# Altium footprint library PCB-PCEIOT.PcbLib: 119 footprints (part 2 of 8)
Each footprint in its own frame and in the unit in brackets; x right, y up, seen from the top. Pads: shape width x height; smd on the part's side, far side on the other; paste and mask are expansions set on the pad; w line width, h text height; cw(c..) or ccw(c..) is an arc to the next point about the centre after c.
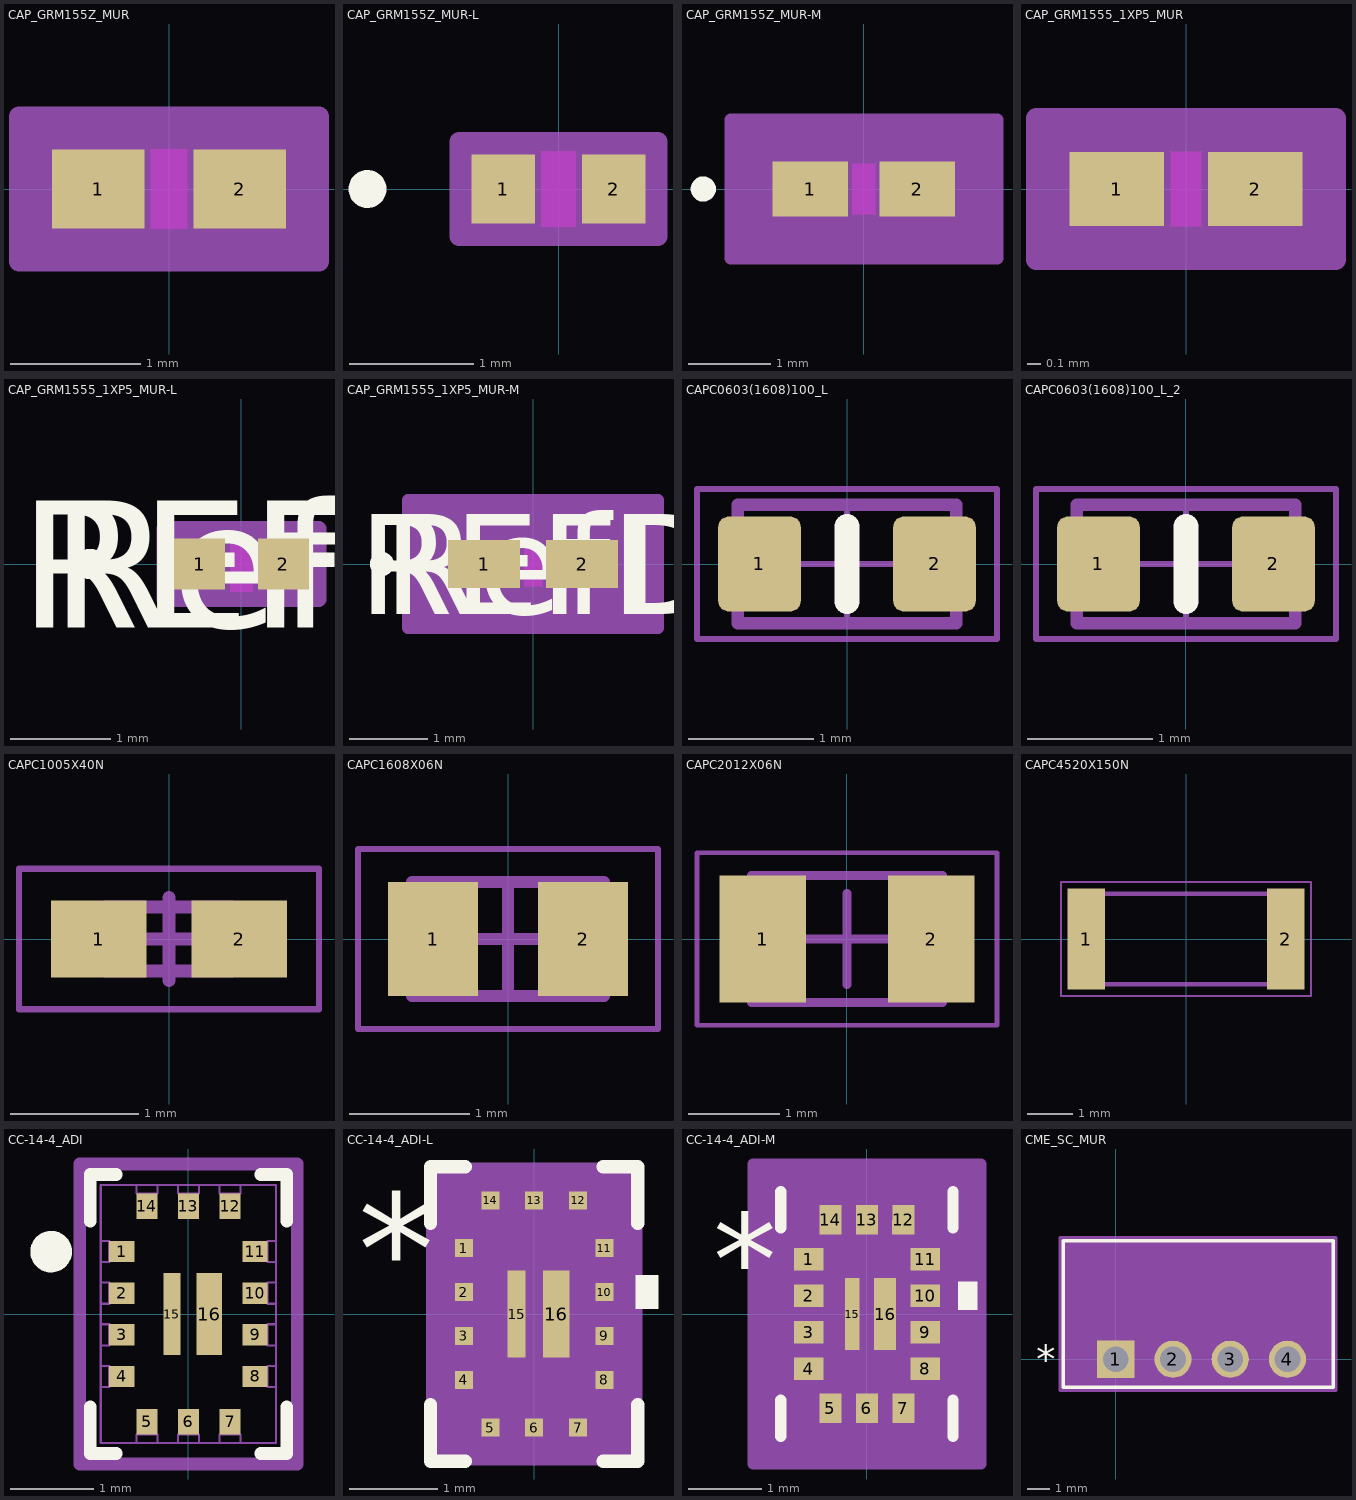
[diagram p1: the footprints below, top view; thin cyan lines are the x and y axes]

## CAP_GRM155Z_MUR [mil]
pads (2):
  rect 28x24 smd paste+0 mask+0: 1(-21.5,0) 2(21.5,0)
Top Layer keep-out:
  region: -5.5,-10 -5.5,10 5.5,10 5.5,-10
Keep-Out Layer:
  region: -5.5,-12 -5.5,12 5.5,12 5.5,-12
Mechanical 13:
  lines w1: -21.5,-12 -21.5,12 ; -21.5,-12 21.5,-12 ; -21.5,-12 -7.5,-12 -7.5,12 -21.5,12 ; -21.5,-12 -21.5,12 ; -21.5,12 21.5,12 ; 21.5,-12 21.5,12 ; 21.5,-12 21.5,12 ; 21.5,-12 7.5,-12 7.5,12 21.5,12
Mechanical 15:
  region: 45.5,-22 -45.5,-22 -45.5,22 45.5,22
  lines w6: -45.5,-22 45.5,-22 45.5,22 -45.5,22 -45.5,-22
3D body "CAP_GRM155Z_MUR.step": height 24.02, standoff 0, extent -21.5,-12.01 21.5,12.01

## CAP_GRM155Z_MUR-L [mil]
pads (2):
  rect 20x22 smd paste+0 mask+0: 1(-17.5,0) 2(17.5,0)
Top Layer keep-out:
  region: -5.5,-10 -5.5,10 5.5,10 5.5,-10
Top Overlay:
  circle w6: c-60.5,0 r3
Keep-Out Layer:
  region: -5.5,-12 -5.5,12 5.5,12 5.5,-12
Mechanical 13:
  circle w1: c-12.5,0 r3
  lines w1: -21.5,-12 -21.5,12 ; -21.5,-12 -7.5,-12 -7.5,12 -21.5,12 ; -21.5,-12 21.5,-12 ; -21.5,-12 -21.5,12 ; -21.5,12 21.5,12 ; 21.5,-12 7.5,-12 7.5,12 21.5,12 ; 21.5,-12 21.5,12 ; 21.5,-12 21.5,12
Mechanical 15:
  region: 31.5,-15 -31.5,-15 -31.5,15 31.5,15
  lines w6: -31.5,-15 -31.5,15 31.5,15 31.5,-15 -31.5,-15
3D body "CAP_GRM155Z_MUR.step": height 24.02, standoff 0, extent -21.5,-12.01 21.5,12.01

## CAP_GRM155Z_MUR-M [mil]
pads (2):
  rect 36x26 smd paste+0 mask+0: 1(-25.5,0) 2(25.5,0)
Top Layer keep-out:
  region: -5.5,-10 -5.5,10 5.5,10 5.5,-10
Top Overlay:
  circle w6: c-76.5,0 r3
Keep-Out Layer:
  region: -5.5,-12 -5.5,12 5.5,12 5.5,-12
Mechanical 13:
  circle w1: c-20.5,0 r3
  lines w1: -21.5,-12 -21.5,12 ; -21.5,-12 -7.5,-12 -7.5,12 -21.5,12 ; -21.5,-12 21.5,-12 ; -21.5,-12 -21.5,12 ; -21.5,12 21.5,12 ; 21.5,-12 7.5,-12 7.5,12 21.5,12 ; 21.5,-12 21.5,12 ; 21.5,-12 21.5,12
Mechanical 15:
  region: 63.5,-33 -63.5,-33 -63.5,33 63.5,33
  lines w6: -63.5,-33 -63.5,33 63.5,33 63.5,-33 -63.5,-33
3D body "CAP_GRM155Z_MUR.step": height 24.02, standoff 0, extent -21.5,-12.01 21.5,12.01

## CAP_GRM1555_1XP5_MUR [mil]
pads (2):
  rect 28x22 smd paste+0 mask+0: 1(-20.5,0) 2(20.5,0)
Top Layer keep-out:
  region: -4.5,-9 -4.5,9 4.5,9 4.5,-9
Top Overlay:
  text ".Designator" at -45,-20 h50
Keep-Out Layer:
  region: -4.5,-11 -4.5,11 4.5,11 4.5,-11
Mechanical 13:
  lines w1: -20.5,-11 -20.5,11 ; -20.5,-11 -6.5,-11 -6.5,11 -20.5,11 ; -20.5,-11 20.5,-11 ; -20.5,-11 -20.5,11 ; -20.5,11 20.5,11 ; 20.5,-11 6.5,-11 6.5,11 20.5,11 ; 20.5,-11 20.5,11 ; 20.5,-11 20.5,11
Mechanical 15:
  region: 44.5,-21 -44.5,-21 -44.5,21 44.5,21
  lines w6: -44.5,-21 -44.5,21 44.5,21 44.5,-21 -44.5,-21
3D body "CAP_GRM1555_1XP5_MUR.step": height 22.01, standoff 0, extent -20.51,-10.98 20.51,10.98

## CAP_GRM1555_1XP5_MUR-L [mil]
pads (2):
  rect 20x20 smd paste+0 mask+0: 1(-16.5,0) 2(16.5,0)
Top Layer keep-out:
  region: -4.5,-9 -4.5,9 4.5,9 4.5,-9
Top Overlay:
  circle w6: c-59.5,0 r3
  text "REFDES" at -87.5,-25 h50
  text "RefDes" at -75,-25 h50
Keep-Out Layer:
  region: -4.5,-11 -4.5,11 4.5,11 4.5,-11
Mechanical 13:
  circle w0: c-11.5,0 r3
  lines w1: -20.5,-11 -20.5,11 ; -20.5,-11 20.5,-11 ; -20.5,-11 -6.5,-11 -6.5,11 -20.5,11 ; -20.5,-11 -20.5,11 ; -20.5,11 20.5,11 ; 20.5,-11 20.5,11 ; 20.5,-11 20.5,11 ; 20.5,-11 6.5,-11 6.5,11 20.5,11
  text "RefDes2" at -87.5,-25 h50
Mechanical 15:
  region: 30.5,-14 -30.5,-14 -30.5,14 30.5,14
  lines w6: -30.5,-14 30.5,-14 30.5,14 -30.5,14 -30.5,-14
3D body "CAP_GRM1555_1XP5_MUR.step": height 22.01, standoff 0, extent -20.51,-10.98 20.51,10.98

## CAP_GRM1555_1XP5_MUR-M [mil]
pads (2):
  rect 36x24 smd paste+0 mask+0: 1(-24.5,0) 2(24.5,0)
Top Layer keep-out:
  region: -4.5,-9 -4.5,9 4.5,9 4.5,-9
Top Overlay:
  circle w6: c-75.5,0 r3
  text "RefDes" at -75,-25 h50
  text "REFDES" at -87.5,-25 h50
Keep-Out Layer:
  region: -4.5,-11 -4.5,11 4.5,11 4.5,-11
Mechanical 13:
  circle w0: c-19.5,0 r3
  lines w1: -20.5,-11 -20.5,11 ; -20.5,-11 -6.5,-11 -6.5,11 -20.5,11 ; -20.5,-11 20.5,-11 ; -20.5,-11 -20.5,11 ; -20.5,11 20.5,11 ; 20.5,-11 6.5,-11 6.5,11 20.5,11 ; 20.5,-11 20.5,11 ; 20.5,-11 20.5,11
  text "RefDes2" at -87.5,-25 h50
Mechanical 15:
  region: 62.5,-32 -62.5,-32 -62.5,32 62.5,32
  lines w6: -62.5,-32 -62.5,32 62.5,32 62.5,-32 -62.5,-32
3D body "CAP_GRM1555_1XP5_MUR.step": height 22.01, standoff 0, extent -20.51,-10.98 20.51,10.98

## CAPC0603(1608)100_L [mm] "Chip Capacitor, Body 1.6x0.8mm, Height 1.0mm, IPC High Density"
height 1
pads (2):
  rrect25% 0.66x0.76 smd: 1(-0.7,0) 2(0.7,0)
Top Overlay:
  lines w0.2: 0,-0.3 0,0.3
Top Courtyard:
  lines w0.05: -0.475,0 0.475,0 ; 0,-0.475 0,0.475 ; -1.2,-0.6 -1.2,0.6 1.2,0.6 1.2,-0.6 -1.2,-0.6
Top Assembly:
  lines w0.1: -0.875,-0.475 0.875,-0.475 0.875,0.475 -0.875,0.475 -0.875,-0.475
Top Designator:
  text ".Designator" at -1.27,-0.127 h0.6
3D body "CAPC1608X95N EIA 0603.STEP": height 0.95, standoff 0, extent -0.8,-0.4 0.8,0.4

## CAPC0603(1608)100_L_2 [mm]
pads (2):
  rrect25% 0.66x0.76 smd: 1(-0.7,0) 2(0.7,0)
Top Overlay:
  lines w0.2: 0,-0.3 0,0.3
Top Courtyard:
  lines w0.05: -0.475,0 0.475,0 ; 0,-0.475 0,0.475 ; -1.2,-0.6 1.2,-0.6 1.2,0.6 -1.2,0.6 -1.2,-0.6
Top Assembly:
  lines w0.1: -0.875,-0.475 -0.875,0.475 0.875,0.475 0.875,-0.475 -0.875,-0.475
Top Designator:
  text ".Designator" at -1.27,-0.127 h1.5
3D body "CAPC1608X95N EIA 0603.STEP": height 0.95, standoff 0, extent -0.8,-0.4 0.8,0.4

## CAPC1005X40N [mm] "Chip Capacitor, 2-Leads, Body 1,0x0,50mm (0402), IPC Medium Density"
pads (2):
  rect 0.75x0.6 smd: 1(-0.55,0) 2(0.55,0)
Mechanical 13:
  lines w0.1: -0.5,-0.25 -0.5,0.25 0.5,0.25 0.5,-0.25 -0.5,-0.25
Mechanical 15:
  lines w0.05: -1.175,-0.55 -1.175,0.55 1.175,0.55 1.175,-0.55 -1.175,-0.55
  lines w0.1: -0.325,0 0.325,0 ; 0,-0.325 0,0.325
  text ".Designator" at 0.272,-2.705 h1.2
3D body "GRM155C81H683KE14D.stp": height 0.55, standoff 0, extent -0.5,-0.25 0.5,0.25

## CAPC1608X06N [mm] "Chip Capacitor, 2-Leads, Body 1,6x0,8mm (0603), IPC Medium Density"
height 0.6
pads (2):
  rect 0.75x0.95 smd: 1(-0.625,0) 2(0.625,0)
Mechanical 13:
  lines w0.1: -0.8,-0.475 -0.8,0.475 0.8,0.475 0.8,-0.475 -0.8,-0.475
Mechanical 15:
  lines w0.05: -1.25,-0.75 -1.25,0.75 1.25,0.75 1.25,-0.75 -1.25,-0.75
  lines w0.1: -0.475,0 0.475,0 ; 0,-0.475 0,0.475
  text ".Designator" at 0.272,-2.705 h1.2
3D body "CAPC-0603-T0.9-BN.stp": height 0.9, standoff 0, extent -0.85,-0.45 0.85,0.45

## CAPC2012X06N [mm] "Chip Capacitor, 2-Leads, Body 2,00x1,25mm (0805), IPC Medium Density"
height 0.55
pads (2):
  rect 0.95x1.4 smd: 1(-0.925,0) 2(0.925,0)
Mechanical 13:
  lines w0.1: -1.05,-0.7 -1.05,0.7 1.05,0.7 1.05,-0.7 -1.05,-0.7
Mechanical 15:
  lines w0.05: -1.65,-0.95 -1.65,0.95 1.65,0.95 1.65,-0.95 -1.65,-0.95
  lines w0.1: -0.5,0 0.5,0 ; 0,-0.5 0,0.5
  text ".Designator" at 0.272,-2.705 h1.2
3D body "CAPC-0805-T0.75-BN.stp": height 0.75, standoff 0, extent -1.05,-0.675 1.05,0.675

## CAPC4520X150N [mm]
pads (2):
  rect 0.82x2.22 smd: 1(-2.2,0) 2(2.2,0)
Mechanical 13:
  lines w0.1: -2.25,-1 2.25,-1 2.25,1 -2.25,1 -2.25,-1
Mechanical 15:
  lines w0.05: -2.76,-1.26 2.76,-1.26 2.76,1.26 -2.76,1.26 -2.76,-1.26
  text ".Designator" at 0.272,-2.705 h1.2
3D body "GR442QR73D102KW01L.stp": height 1.5, standoff 0, extent -2.25,-1 2.25,1

## CC-14-4_ADI [mil]
pads (16):
  rect 12x10 smd paste+0 mask+0: 1(-31.5,29.53) 2(-31.5,9.84) 3(-31.5,-9.84) 4(-31.5,-29.53) 8(31.5,-29.53) 9(31.5,-9.84) 10(31.5,9.84) 11(31.5,29.53)
  rect 10x12 smd paste+0 mask+0: 5(-19.68,-51) 6(0,-51) 7(19.68,-51) 12(19.68,51) 13(0,51) 14(-19.68,51)
  rect 8x39 smd paste+0 mask+0: 15(-7.87,0)
  rect 12x39 smd paste+0 mask+0: 16(9.84,0)
Top Overlay:
  circle w9.84: c-65,29.53 r4.92
  lines w6: -46.5,-44.05 -46.5,-66 -34.2,-66 ; -46.5,44.05 -46.5,66 -34.2,66 ; 34.2,-66 46.5,-66 46.5,-44.05 ; 34.2,66 46.5,66 46.5,44.05
Mechanical 13:
  lines w1: -41.5,-61 41.5,-61 41.5,61 -41.5,61 -41.5,-61 ; -41.5,-34.53 -41.5,-24.53 -37.5,-24.53 -37.5,-34.53 -41.5,-34.53 ; -41.5,-14.84 -41.5,-4.84 -37.5,-4.84 -37.5,-14.84 -41.5,-14.84 ; -41.5,4.84 -41.5,14.84 -37.5,14.84 -37.5,4.84 -41.5,4.84 ; -41.5,24.53 -41.5,34.53 -37.5,34.53 -37.5,24.53 -41.5,24.53 ; -24.68,-61 -14.69,-61 -14.69,-57 -24.68,-57 -24.68,-61 ; -24.68,57 -14.69,57 -14.69,61 -24.68,61 -24.68,57 ; -5,-61 5,-61 5,-57 -5,-57 -5,-61 ; -5,57 5,57 5,61 -5,61 -5,57 ; 14.69,-61 24.68,-61 24.68,-57 14.69,-57 14.69,-61 ; 14.69,57 24.68,57 24.68,61 14.69,61 14.69,57 ; 37.5,-34.53 41.5,-34.53 41.5,-24.53 37.5,-24.53 37.5,-34.53 ; 37.5,-14.84 41.5,-14.84 41.5,-4.84 37.5,-4.84 37.5,-14.84 ; 37.5,4.84 41.5,4.84 41.5,14.84 37.5,14.84 37.5,4.84 ; 37.5,24.53 41.5,24.53 41.5,34.53 37.5,34.53 37.5,24.53
Mechanical 15:
  lines w6: -51.5,-71 -51.5,-44.53 -51.5,44.53 -51.5,71 -34.69,71 34.69,71 51.5,71 51.5,44.53 51.5,-44.53 51.5,-71 34.69,-71 -34.69,-71 -51.5,-71
  text ".Designator" at 14.54,-106.48 h47.24
3D body "CC-14-4_ADI.step": height 29.09, standoff 0, extent -41.5,-60.98 41.5,60.98

## CC-14-4_ADI-L [mil]
pads (16):
  rect 8.06x8.03 smd paste+0 mask+0: 1(-31.5,29.53) 2(-31.5,9.84) 3(-31.5,-9.84) 4(-31.5,-29.53) 8(31.5,-29.53) 9(31.5,-9.84) 10(31.5,9.84) 11(31.5,29.53)
  rect 8.03x8.06 smd paste+0 mask+0: 5(-19.68,-51) 6(0,-51) 7(19.68,-51) 12(19.68,51) 13(0,51) 14(-19.68,51)
  rect 8x39 smd paste+0 mask+0: 15(-7.87,0)
  rect 12x39 smd paste+0 mask+0: 16(9.84,0)
Top Overlay:
  region: 45.53,17.34 55.53,17.34 55.53,2.34 45.53,2.34
  lines w6: -46.5,-40.71 -46.5,-66 -30.86,-66 ; -46.5,40.71 -46.5,66 -30.86,66 ; 30.86,-66 46.5,-66 46.5,-40.71 ; 30.86,66 46.5,66 46.5,40.71
  text "*" at -79.03,4.53 h50
Mechanical 13:
  lines w1: -41.5,11 8.5,61 ; -41.5,-61 41.5,-61 41.5,61 -41.5,61 -41.5,-61 ; -41.5,-34.53 -41.5,-24.53 -37.5,-24.53 -37.5,-34.53 -41.5,-34.53 ; -41.5,-14.84 -41.5,-4.84 -37.5,-4.84 -37.5,-14.84 -41.5,-14.84 ; -41.5,4.84 -41.5,14.84 -37.5,14.84 -37.5,4.84 -41.5,4.84 ; -41.5,24.53 -41.5,34.53 -37.5,34.53 -37.5,24.53 -41.5,24.53 ; -24.68,-61 -14.69,-61 -14.69,-57 -24.68,-57 -24.68,-61 ; -24.68,57 -14.69,57 -14.69,61 -24.68,61 -24.68,57 ; -5,-61 5,-61 5,-57 -5,-57 -5,-61 ; -5,57 5,57 5,61 -5,61 -5,57 ; 14.69,-61 24.68,-61 24.68,-57 14.69,-57 14.69,-61 ; 14.69,57 24.68,57 24.68,61 14.69,61 14.69,57 ; 37.5,-34.53 41.5,-34.53 41.5,-24.53 37.5,-24.53 37.5,-34.53 ; 37.5,-14.84 41.5,-14.84 41.5,-4.84 37.5,-4.84 37.5,-14.84 ; 37.5,4.84 41.5,4.84 41.5,14.84 37.5,14.84 37.5,4.84 ; 37.5,24.53 41.5,24.53 41.5,34.53 37.5,34.53 37.5,24.53
Mechanical 15:
  region: -27.7,-65 -45.5,-65 -45.5,-37.54 -45.5,37.54 -45.5,65 -27.7,65 27.7,65 45.5,65 45.5,37.54 45.5,-37.54 45.5,-65 27.7,-65
  lines w6: -45.5,-65 -45.5,-37.54 -45.5,37.54 -45.5,65 -27.7,65 27.7,65 45.5,65 45.5,37.54 45.5,-37.54 45.5,-65 27.7,-65 -27.7,-65 -45.5,-65
3D body "CC-14-4_ADI.step": height 29.09, standoff 0, extent -41.5,-60.98 41.5,60.98

## CC-14-4_ADI-M [mil]
pads (16):
  rect 15.94x11.97 smd paste+0 mask+0: 1(-31.5,29.53) 2(-31.5,9.84) 3(-31.5,-9.84) 4(-31.5,-29.53) 8(31.5,-29.53) 9(31.5,-9.84) 10(31.5,9.84) 11(31.5,29.53)
  rect 11.97x15.94 smd paste+0 mask+0: 5(-19.68,-51) 6(0,-51) 7(19.68,-51) 12(19.68,51) 13(0,51) 14(-19.68,51)
  rect 8x39 smd paste+0 mask+0: 15(-7.87,0)
  rect 12x39 smd paste+0 mask+0: 16(9.84,0)
Top Overlay:
  region: 49.47,17.34 59.47,17.34 59.47,2.34 49.47,2.34
  lines w6: -46.5,-66 -46.5,-46.56 ; -46.5,46.56 -46.5,66 ; 46.5,-66 46.5,-46.56 ; 46.5,46.56 46.5,66
  text "*" at -82.97,4.53 h50
Mechanical 13:
  lines w1: -41.5,11 8.5,61 ; -41.5,-61 41.5,-61 41.5,61 -41.5,61 -41.5,-61 ; -41.5,-34.53 -41.5,-24.53 -37.5,-24.53 -37.5,-34.53 -41.5,-34.53 ; -41.5,-14.84 -41.5,-4.84 -37.5,-4.84 -37.5,-14.84 -41.5,-14.84 ; -41.5,4.84 -41.5,14.84 -37.5,14.84 -37.5,4.84 -41.5,4.84 ; -41.5,24.53 -41.5,34.53 -37.5,34.53 -37.5,24.53 -41.5,24.53 ; -24.68,-61 -14.69,-61 -14.69,-57 -24.68,-57 -24.68,-61 ; -24.68,57 -14.69,57 -14.69,61 -24.68,61 -24.68,57 ; -5,-61 5,-61 5,-57 -5,-57 -5,-61 ; -5,57 5,57 5,61 -5,61 -5,57 ; 14.69,-61 24.68,-61 24.68,-57 14.69,-57 14.69,-61 ; 14.69,57 24.68,57 24.68,61 14.69,61 14.69,57 ; 37.5,-34.53 41.5,-34.53 41.5,-24.53 37.5,-24.53 37.5,-34.53 ; 37.5,-14.84 41.5,-14.84 41.5,-4.84 37.5,-4.84 37.5,-14.84 ; 37.5,4.84 41.5,4.84 41.5,14.84 37.5,14.84 37.5,4.84 ; 37.5,24.53 41.5,24.53 41.5,34.53 37.5,34.53 37.5,24.53
  text "*" at -5.03,4.53 h50
Mechanical 15:
  region: -45.67,-81 -61.5,-81 -61.5,-55.51 -61.5,55.51 -61.5,81 -45.67,81 45.67,81 61.5,81 61.5,55.51 61.5,-55.51 61.5,-81 45.67,-81
  lines w6: -61.5,-81 -61.5,-55.51 -61.5,55.51 -61.5,81 -45.67,81 45.67,81 61.5,81 61.5,55.51 61.5,-55.51 61.5,-81 45.67,-81 -45.67,-81 -61.5,-81
3D body "CC-14-4_ADI.step": height 29.09, standoff 0, extent -41.5,-60.98 41.5,60.98

## CME_SC_MUR [mil]
pads (4):
  rect 65x65 hole 45 paste-99999 mask+0: 1(0,0)
  round 65 hole 45 paste-99999 mask+0: 2(100,0) 3(200,0) 4(300,0)
Top Overlay:
  lines w6: -92,-49 380,-49 380,207 -92,207 -92,-49
  text "*" at -139.5,-25 h50
  text ".Designator" at 6.5,54 h50
Mechanical 13:
  lines w1: -87,-44 375,-44 375,202 -87,202 -87,-44
  text ".Designator" at 6.5,54 h50
  text "*" at -89.5,-25 h50
Mechanical 15:
  region: 385,-54 -97,-54 -97,212 385,212
  lines w6: -97,-54 -97,212 385,212 385,-54 -97,-54
3D body "CME_SC_MUR.step": height 404.02, standoff -240, extent -80.98,-122.99 380.98,122.99